# Altium footprint library TH_Connectors.PcbLib: 84 footprints (part 6 of 6)
Each footprint in its own frame and in the unit in brackets; x right, y up, seen from the top. Pads: shape width x height; smd on the part's side, far side on the other; paste and mask are expansions set on the pad; w line width, h text height; cw(c..) or ccw(c..) is an arc to the next point about the centre after c.
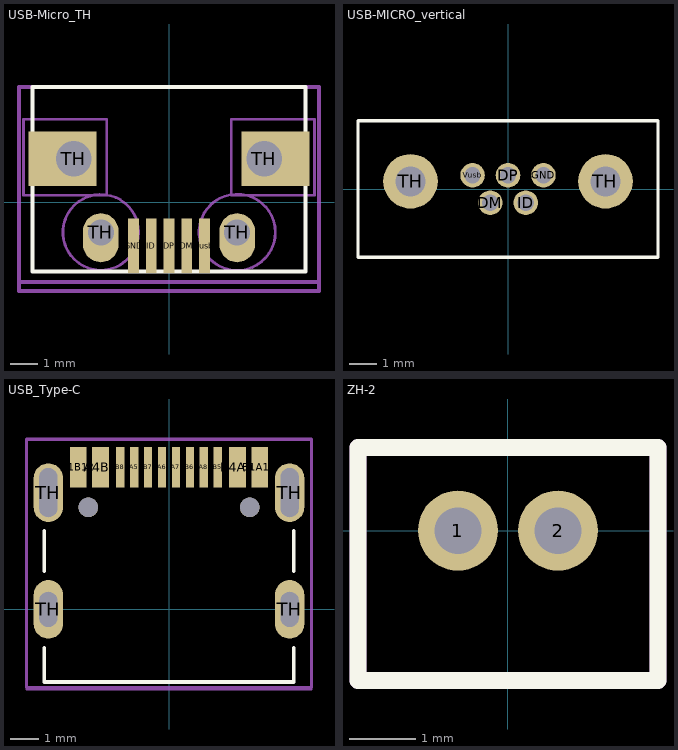
[diagram p5: the footprints below, top view; thin cyan lines are the x and y axes]

## USB-Micro_TH [mm]
pads (9):
  rect 0.4x2 smd: DM(0.65,-1.6) DP(0,-1.6) GND(-1.3,-1.6) ID(-0.65,-1.6) Vusb(1.3,-1.6)
  rect 2.5x2 / inner rect 2.5x2 / far side rect 2x2 hole 1.3 copper offset -0.4,0: TH(-3.5,1.6)
  oval 1.3x1.8 hole 0.95 copper offset 0,-0.2: TH(-2.5,-1.1) TH(2.5,-1.1)
  rect 2.5x2 / inner rect 2.5x2 / far side rect 2x2 hole 1.3 copper offset 0.4,0: TH(3.5,1.6)
Top Overlay:
  lines w0.15: -5,-2.54 -5,4.225 5,4.225 5,-2.54 -5,-2.54
Top Assembly:
  lines w0.15: -5.5,-3.25 5.5,-3.25 5.5,4.225 -5.5,4.225 -5.5,-3.25
Top Courtyard:
  lines w0.15: -5.5,-2.922 -5.5,4.225 5.5,4.225 5.5,-2.922 -5.5,-2.922
Bottom Courtyard (Mech16):
  circle w0.1: c2.5,-1.1 r1.4
  circle w0.1: c-2.5,-1.1 r1.388
  lines w0.1: -5.334,0.254 -5.334,3.048 -2.286,3.048 -2.286,0.254 -5.334,0.254 ; 2.286,0.254 2.286,3.048 5.334,3.048 5.334,0.254 2.286,0.254
3D body "Micro USB-B Female 5Pin SMD.STEP": height 2.7, standoff -1.02, extent -4.05,-1.575 4,4.225

## USB-MICRO_vertical [mm]
pads (7):
  round 0.9 hole 0.6: DM(-0.65,-0.5) DP(0,0.5) GND(1.3,0.5) ID(0.65,-0.5) Vusb(-1.3,0.5)
  round 2 hole 1.1: TH(-3.575,0.28) TH(3.575,0.28)
Top Overlay:
  lines w0.127: -5.5,-2.5 -5.5,2.5 5.5,2.5 5.5,-2.5 -5.5,-2.5

## USB_Type-C [mm]
pads (18):
  rect 0.6x1.45 smd: A1B12(-3.25,5.095) A4B9(-2.45,5.095) B1A12(3.25,5.095) B4A9(2.45,5.095)
  rect 0.3x1.45 smd: A5(-1.25,5.095) A6(-0.25,5.095) A7(0.25,5.095) A8(1.25,5.095) B5(1.75,5.095) B6(0.75,5.095) B7(-0.75,5.095) B8(-1.75,5.095)
  oval 1.05x2.1 hole 0.65 slot 1.25 at 90 deg: TH(-4.32,0) TH(4.32,0)
  oval 1.05x2.1 hole 0.65 slot 1.75 at 90 deg: TH(-4.32,4.18) TH(4.32,4.18)
  round 0.7 hole 0.7 unplated: ""(-2.89,3.65) ""(2.89,3.65)
Top Overlay:
  lines w0.127: -4.47,-1.37 -4.47,-2.6 4.47,-2.6 4.47,-1.37 ; -4.47,1.37 -4.47,2.81 ; 4.47,1.37 4.47,2.81
Top Assembly:
  lines w0.1: -5.1,-2.8 5.1,-2.8 5.1,6.1 -5.1,6.1 -5.1,-2.8
Top Courtyard:
  lines w0.1: -5.095,-2.85 5.095,-2.85 5.095,6.07 -5.095,6.07 -5.095,-2.85
3D body "User Library-USB - C.x_b": height 3.26, standoff -1, extent -4.475,-2.5 4.475,5.25

## ZH-2 [mm]
pads (2):
  round 1.2 hole 0.7: 1(-0.75,0) 2(0.75,0)
Top Overlay:
  lines w0.254: -2.25,-2.25 2.25,-2.25 2.25,1.25 -2.25,1.25 -2.25,-2.25
Top Assembly:
  lines w0.254: -2.25,-2.25 -2.25,1.25 2.25,1.25 2.25,-2.25 -2.25,-2.25
Top Courtyard:
  lines w0.254: -2.25,-2.25 2.25,-2.25 2.25,1.25 -2.25,1.25 -2.25,-2.25
3D body "User Library-B2B-ZR(LF)(SN).STEP": height 4.5, standoff -2.7, extent -2.25,-2.25 2.25,1.25